# Altium footprint library CommonFootprints_V1.PcbLib: 80 footprints (part 3 of 5)
Each footprint in its own frame and in the unit in brackets; x right, y up, seen from the top. Pads: shape width x height; smd on the part's side, far side on the other; paste and mask are expansions set on the pad; w line width, h text height; cw(c..) or ccw(c..) is an arc to the next point about the centre after c.
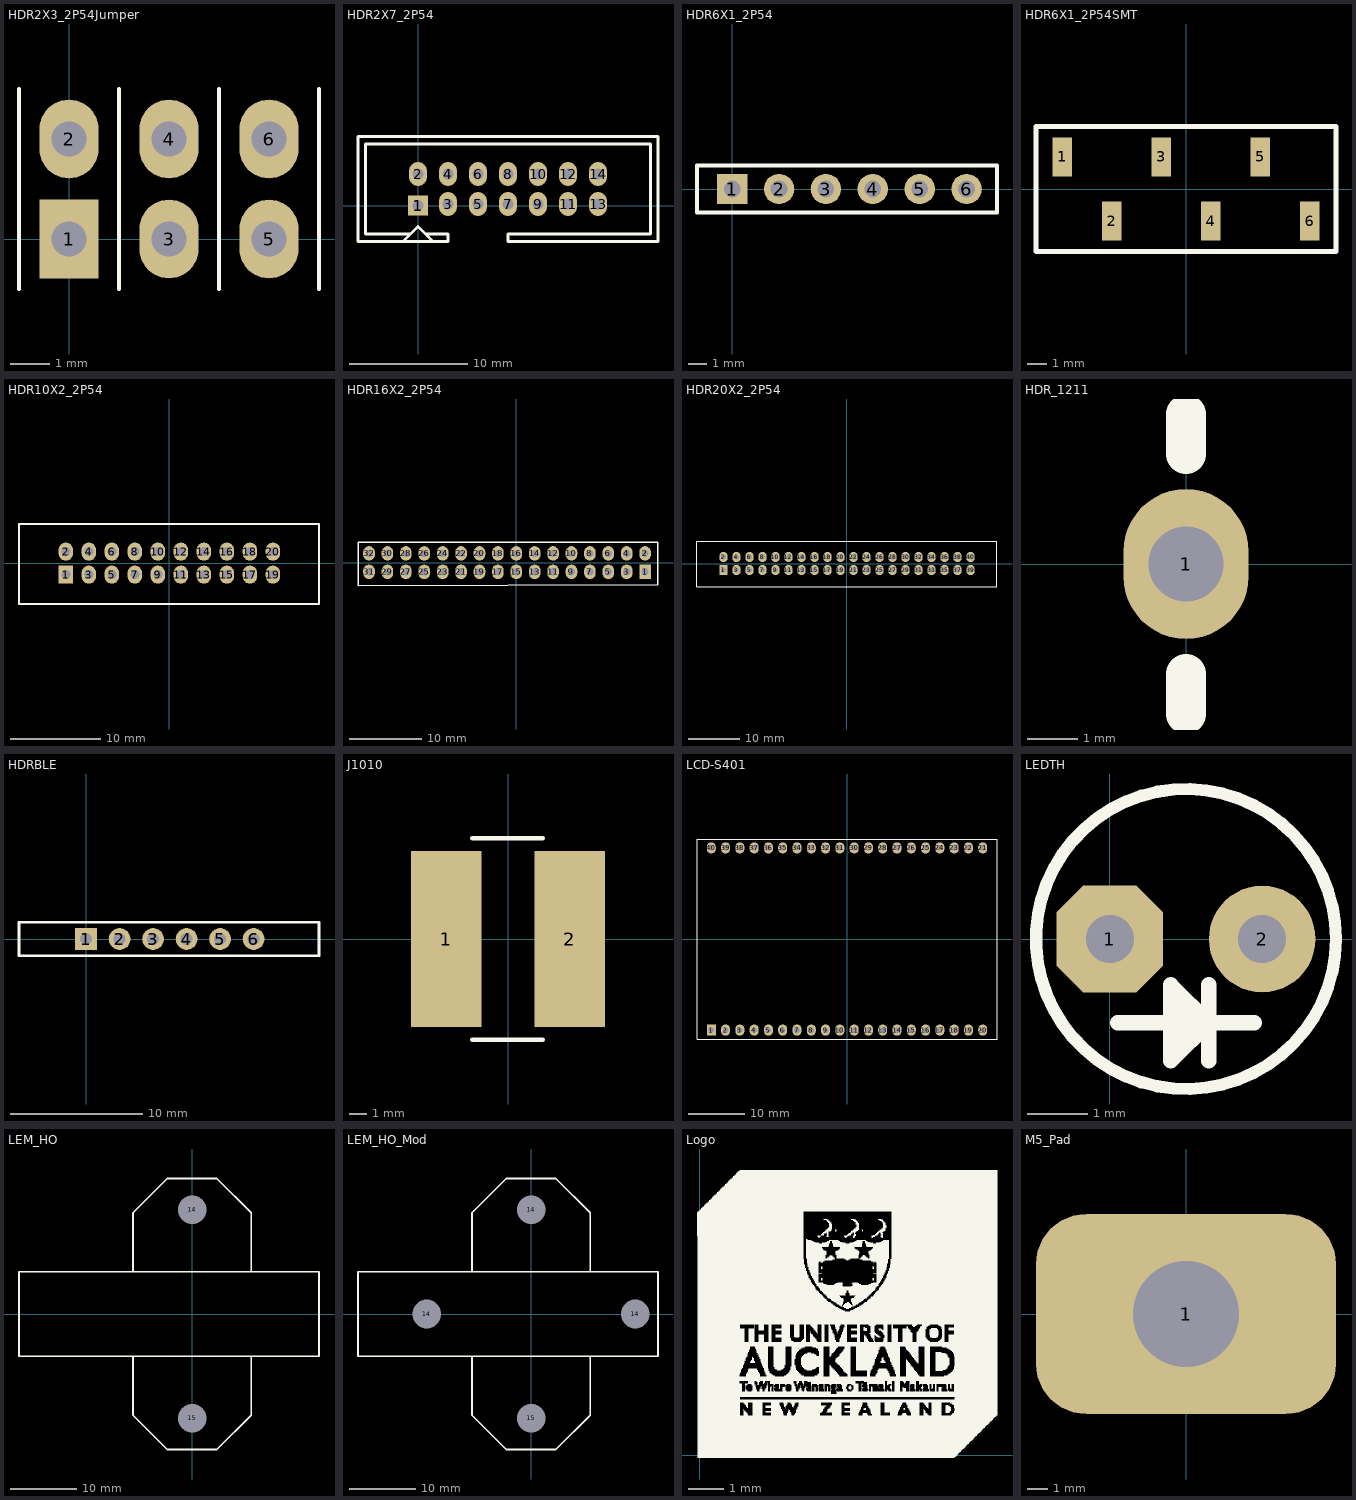
[diagram p2: the footprints below, top view; thin cyan lines are the x and y axes]

## HDR2X3_2P54Jumper [mm] "IDC 3X2 Way 2.54 pitch"
height 9.3
pads (6):
  rect 1.5x2 hole 0.9: 1(0,0)
  oval 1.5x2 hole 0.9 paste+0: 2(0,2.54)
  oval 1.5x2 hole 0.9: 3(2.54,0) 4(2.54,2.54) 5(5.08,0) 6(5.08,2.54)
Top Overlay:
  lines w0.1: -1.27,-1.27 -1.27,3.81 ; 1.27,-1.27 1.27,3.81 ; 3.81,-1.27 3.81,3.81 ; 6.35,-1.27 6.35,3.81

## HDR2X7_2P54 [mil] "IDC 14 pin 2.54 pitch"
height 354.33
pads (14):
  rect 66.93x66.93 hole 35.43: 1(0,0)
  oval 60x80 hole 35.43: 2(0,105) 3(100,5) 4(100,105) 5(200,5) 6(200,105) 7(300,5) 8(300,105) 9(400,5) 10(400,105) 11(500,5) 12(500,105) 13(600,5) 14(600,105)
Top Overlay:
  lines w10: -50,-120 0,-70 50,-120 ; -25,-95 -175,-95 -175,205 575,205 775,205 775,-95 575,-95 300,-95 300,-120 600,-120 800,-120 800,230 600,230 -200,230 -200,-120 100,-120 100,-95 25,-95

## HDR6X1_2P54 [mil] "Connector for BLE"
pads (6):
  rect 65x65 hole 35.43: 1(0,0)
  round 65 hole 35.43: 2(100,0) 3(200,0) 4(300,0) 5(400,0) 6(500,0)
Top Overlay:
  lines w7.87: -75,-50 -75,50 565,50 565,-50 -75,-50
3D body "6x1, Male, Header, 0.1in pitch.stp": height 334.06, standoff -105.94, extent -55,-50 545,50

## HDR6X1_2P54SMT [mm]
pads (6):
  rect 1x2 smd: 1(-6.35,1.65) 2(-3.81,-1.65) 3(-1.27,1.65) 4(1.27,-1.65) 5(3.81,1.65) 6(6.35,-1.65)
Top Overlay:
  lines w0.254: -7.7,-3.2 -7.7,3.2 7.7,3.2 7.7,-3.2 -7.7,-3.2
3D body: height 7.5, standoff 0, extent -7.7,-3.2 7.7,3.2

## HDR10X2_2P54 [mm]
pads (20):
  rect 1.6x2 hole 1: 1(-11.43,-1.27)
  oval 1.6x2 hole 1: 2(-11.43,1.27) 3(-8.89,-1.27) 4(-8.89,1.27) 5(-6.35,-1.27) 6(-6.35,1.27) 7(-3.81,-1.27) 8(-3.81,1.27) 9(-1.27,-1.27) 10(-1.27,1.27) 11(1.27,-1.27) 12(1.27,1.27) 13(3.81,-1.27) 14(3.81,1.27) 15(6.35,-1.27) 16(6.35,1.27) 17(8.89,-1.27) 18(8.89,1.27) 19(11.43,-1.27) 20(11.43,1.27)
Top Overlay:
  lines w0.2: -16.6,-4.5 16.51,-4.5 16.51,4.318 -16.6,4.318 -16.6,-4.5
3D body "HDR10X2_v2.stp": height 9.25, standoff -3.35, extent -16.6,-4.5 16.6,4.4

## HDR16X2_2P54 [mm]
pads (32):
  rect 1.6x2 hole 1: 1(17.78,-1.27)
  oval 1.6x2 hole 1: 2(17.78,1.27) 3(15.24,-1.27) 4(15.24,1.27) 5(12.7,-1.27) 6(12.7,1.27) 7(10.16,-1.27) 8(10.16,1.27) 9(7.62,-1.27) 10(7.62,1.27) 11(5.08,-1.27) 12(5.08,1.27) 13(2.54,-1.27) 14(2.54,1.27) 15(0,-1.27) 16(0,1.27) 17(-2.54,-1.27) 18(-2.54,1.27) 19(-5.08,-1.27) 20(-5.08,1.27) 21(-7.62,-1.27) 22(-7.62,1.27) 23(-10.16,-1.27) 24(-10.16,1.27) 25(-12.7,-1.27) 26(-12.7,1.27) 27(-15.24,-1.27) 28(-15.24,1.27) 29(-17.78,-1.27) 30(-17.78,1.27) 31(-20.32,-1.27) 32(-20.32,1.27)
Top Overlay:
  lines w0.2: -21.844,-3.175 -21.844,2.794 19.558,2.794 19.558,-3.048 -21.844,-3.175
3D body "Pin Header 2x16 TH Pitch 2.54mm.stp": height 9.5, standoff -3.2, extent -21.59,-2.54 19.05,2.54

## HDR20X2_2P54 [mm]
pads (40):
  rect 1.6x2 hole 1: 1(-24.13,-1.27)
  oval 1.6x2 hole 1: 2(-24.13,1.27) 3(-21.59,-1.27) 4(-21.59,1.27) 5(-19.05,-1.27) 6(-19.05,1.27) 7(-16.51,-1.27) 8(-16.51,1.27) 9(-13.97,-1.27) 10(-13.97,1.27) 11(-11.43,-1.27) 12(-11.43,1.27) 13(-8.89,-1.27) 14(-8.89,1.27) 15(-6.35,-1.27) 16(-6.35,1.27) 17(-3.81,-1.27) 18(-3.81,1.27) 19(-1.27,-1.27) 20(-1.27,1.27) 21(1.27,-1.27) 22(1.27,1.27) 23(3.81,-1.27) 24(3.81,1.27) 25(6.35,-1.27) 26(6.35,1.27) 27(8.89,-1.27) 28(8.89,1.27) 29(11.43,-1.27) 30(11.43,1.27) 31(13.97,-1.27) 32(13.97,1.27) 33(16.51,-1.27) 34(16.51,1.27) 35(19.05,-1.27) 36(19.05,1.27) 37(21.59,-1.27) 38(21.59,1.27) 39(24.13,-1.27) 40(24.13,1.27)
Top Overlay:
  lines w0.2: -29.3,-4.5 -29.3,4.318 29.3,4.318 29.3,-4.5 -29.3,-4.5
3D body "HDR20x2_v2.step": height 9.25, standoff -3.35, extent -29.3,-4.5 29.3,4.4

## HDR_1211 [mm]
pads (1):
  oval 2.5x3 hole 1.5: 1(0,0)
Top Overlay:
  lines w0.8: 0,-3 0,-2.2 ; 0,2.2 0,3
3D body: height 3, standoff 0.5, extent -0.508,-3 0.508,3.048
3D body: height 7, standoff 3, extent -0.508,-2.008 0.508,2.056

## HDRBLE [mil] "Connector for BLE"
pads (6):
  rect 65x65 hole 35.43: 1(0,0)
  round 65 hole 35.43: 2(100,0) 3(200,0) 4(300,0) 5(400,0) 6(500,0)
Top Overlay:
  lines w7.87: -200,-50 -200,50 695,50 695,-50 -200,-50

## J1010 [mm]
pads (2):
  rect 4x10 smd: 1(-3.5,0) 2(3.5,0)
Top Overlay:
  lines w0.254: -2.032,-5.715 1.968,-5.715 ; -2.032,5.715 1.968,5.715

## LCD-S401 [mm]
pads (40):
  rect 1.6x2 hole 1: 1(-24.13,-16.195)
  oval 1.6x2 hole 1: 2(-21.59,-16.195) 3(-19.05,-16.195) 4(-16.51,-16.195) 5(-13.97,-16.195) 6(-11.43,-16.195) 7(-8.89,-16.195) 8(-6.35,-16.195) 9(-3.81,-16.195) 10(-1.27,-16.195) 11(1.27,-16.195) 12(3.81,-16.195) 13(6.35,-16.195) 14(8.89,-16.195) 15(11.43,-16.195) 16(13.97,-16.195) 17(16.51,-16.195) 18(19.05,-16.195) 19(21.59,-16.195) 20(24.13,-16.195) 21(24.13,16.195) 22(21.59,16.195) 23(19.05,16.195) 24(16.51,16.195) 25(13.97,16.195) 26(11.43,16.195) 27(8.89,16.195) 28(6.35,16.195) 29(3.81,16.195) 30(1.27,16.195) 31(-1.27,16.195) 32(-3.81,16.195) 33(-6.35,16.195) 34(-8.89,16.195) 35(-11.43,16.195) 36(-13.97,16.195) 37(-16.51,16.195) 38(-19.05,16.195) 39(-21.59,16.195) 40(-24.13,16.195)
Top Overlay:
  lines w0.2: -26.67,-17.78 26.67,-17.78 26.67,17.78 -26.67,17.78 -26.67,-17.78
3D body "LCD-7.STEP": height 7.93, standoff -2.52, extent -25.9,-16.775 25.4,16.775

## LEDTH [mil] "LED through hole"
pads (2):
  oct 70x70 hole 31.5: 1(0,0)
  round 70 hole 31.5: 2(100,0)
Top Overlay:
  circle w8: c50,0 r98.42
  lines w10: 5,-55 95,-55 ; 49.69,-70.31 49.69,-40.31 50,-40 ; 65,-80 65,-30 ; 40,-80 40,-30 65,-55 40,-80

## LEM_HO [mm]
pads (2):
  round 1.524 hole 4.3: 14(0,15.7) 15(0,-15.7)
Top Overlay:
  lines w0.254: -8.89,-6.35 -8.89,-15.24 -3.73,-20.4 3.73,-20.4 8.89,-15.24 8.89,-6.35 ; -8.89,6.35 -8.89,15.24 -3.73,20.4 3.73,20.4 8.89,15.24 8.89,6.35 ; -26.05,-6.35 -26.05,6.35 19.105,6.35 19.105,-6.35 -26.05,-6.35
3D body "LEM_HOSeries_Assembly.step": height 33.15, standoff 0, extent -26.05,-20.4 19.105,20.4

## LEM_HO_Mod [mm]
pads (4):
  round 1.524 hole 4.3: 14(-15.7,0) 14(0,15.7) 14(15.7,0) 15(0,-15.7)
Top Overlay:
  lines w0.254: -8.89,-6.35 -8.89,-15.24 -3.73,-20.4 3.73,-20.4 8.89,-15.24 8.89,-6.35 ; -8.89,6.35 -8.89,15.24 -3.73,20.4 3.73,20.4 8.89,15.24 8.89,6.35 ; -26.05,-6.35 -26.05,6.35 19.105,6.35 19.105,-6.35 -26.05,-6.35
3D body "LEM_HOSeries_Assembly.step": height 33.15, standoff 0, extent -26.05,-20.4 19.105,20.4

## Logo [mm]
Top Overlay:
  drawing of 24 lines, arcs and shapes, not listed

## M5_Pad [mm]
pads (1):
  rrect50% 15x10 hole 5.3: 1(0,0)